# Altium footprint library PCB_Footprints.PcbLib: 303 footprints (part 10 of 19)
Each footprint in its own frame and in the unit in brackets; x right, y up, seen from the top. Pads: shape width x height; smd on the part's side, far side on the other; paste and mask are expansions set on the pad; w line width, h text height; cw(c..) or ccw(c..) is an arc to the next point about the centre after c.
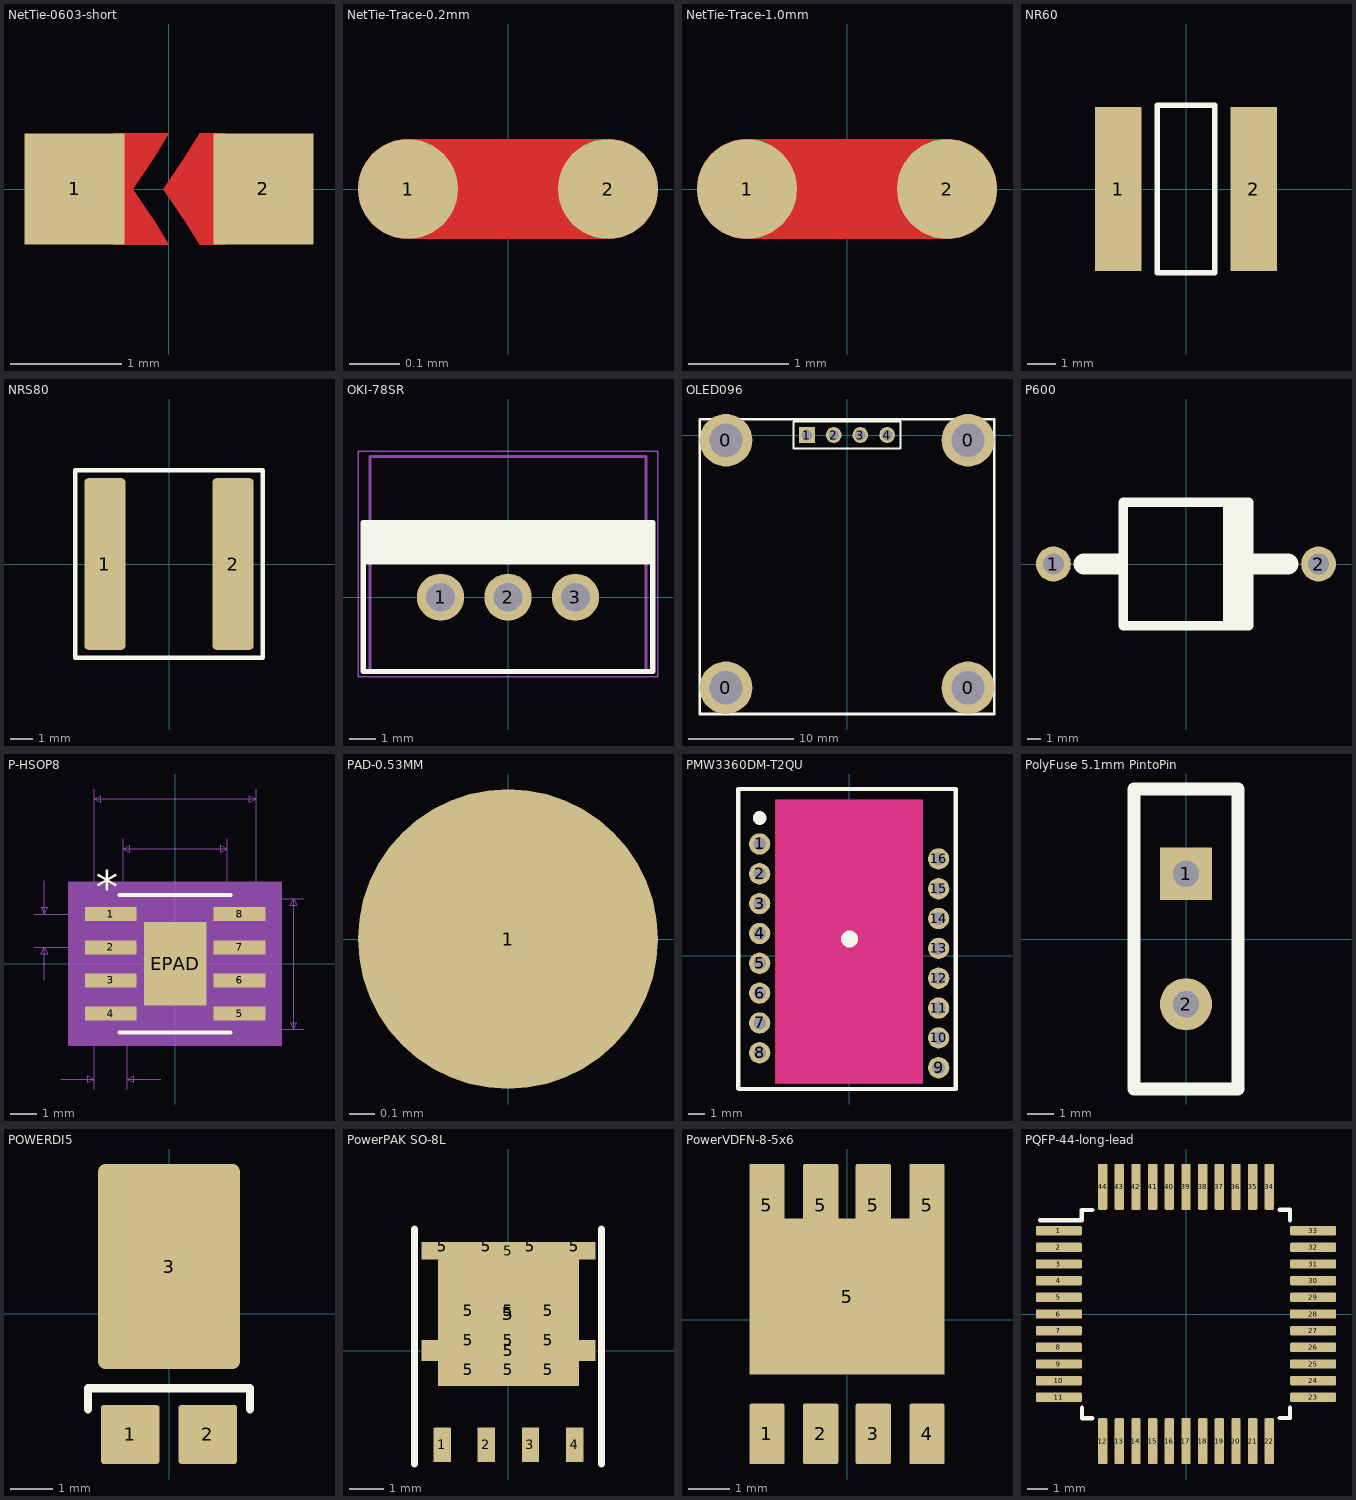
[diagram p9: the footprints below, top view; thin cyan lines are the x and y axes]

## NetTie-0603-short [mm] "Net Tie with an EIA 0603 land pattern"
pads (2):
  rect 0.9x1 smd paste-1 mask+0.102: 1(-0.85,0) 2(0.85,0)
Top Layer:
  region: 0.5,0.5 0.275,0.5 0.15,0.3 -0.05,0 0.15,-0.3 0.275,-0.5 0.5,-0.5
  region: -0.5,0.5 0,0.5 -0.125,0.3 -0.325,0 -0.125,-0.3 0,-0.5 -0.5,-0.5
Top Solder:
  region: -0.5,0.5 0.5,0.5 0.5,-0.5 -0.5,-0.5

## NetTie-Trace-0.2mm [mm] "Net Tie with a 0.2mm trace"
pads (2):
  round 0.2 smd paste-1 mask+0.102: 1(-0.2,0) 2(0.2,0)
Top Layer:
  lines w0.2: -0.2,0 0.2,0

## NetTie-Trace-1.0mm [mm] "Net Tie with a 1.0mm trace"
pads (2):
  round 1 smd paste-1 mask+0: 1(-1,0) 2(1,0)
Top Layer:
  lines w1: -1,0 1,0

## NR60 [mm] "Tayo Yuden NR60 Inductor serie."
height 2.8
pads (2):
  rect 1.6x5.7 smd: 1(-2.35,0) 2(2.35,0)
Top Overlay:
  lines w0.2: -1,-2.9 -1,2.9 1,2.9 1,-2.9 -1,-2.9
3D body: height 1, standoff 0, extent -3,-3 3,3
3D body: height 2.8, standoff 0, extent -3,-3 3,3

## NRS80 [mm] "Tayo Yuden NRS80 Inductor serie. from Manufacturer page for NRS8040T470MJGKV"
height 4.2
pads (2):
  rrect20% 1.8x7.5 smd: 1(-2.8,0) 2(2.8,0)
Top Overlay:
  lines w0.2: -4.1,-4.1 4.1,-4.1 4.1,4.1 -4.1,4.1 -4.1,-4.1
3D body: height 4.2, standoff 0, extent -4,-4 4,4

## OKI-78SR [mm] "Non-Isolated Switching Regulator DC-DC TO-220"
height 16.5
pads (3):
  round 1.78 hole 1.08: 1(-2.54,0) 2(0,0) 3(2.54,0)
Top Overlay:
  region: -5.45,2.8 5.45,2.8 5.5,2.75 5.5,1.25 -5.5,1.25
  lines w0.2: -5.45,-2.8 -5.45,2.8 5.45,2.8 5.45,-2.8 -5.45,-2.8
Mechanical 13:
  lines w0.1: -5.2,-2.8 5.2,-2.8 5.2,5.3 -5.2,5.3 -5.2,-2.8
Mechanical 15:
  lines w0.05: -5.65,-3 -5.65,5.5 5.65,5.5 5.65,-3 -5.65,-3
  lines w0.1: -0.45,0 0.45,0 ; 0,-0.45 0,0.45
3D body "User Library-OKI-78SR_Vert.STEP": height 16.6, standoff -3.2, extent -5.2,-2.823 5.2,5.25

## OLED096 [mm] "OLED096"
pads (8):
  round 5 hole 3.15: 0(-11.5,-24) 0(-11.5,-0.5) 0(11.5,-24) 0(11.5,-0.5)
  rect 1.5x1.5 hole 1: 1(-3.81,0)
  round 1.5 hole 1: 2(-1.27,0) 3(1.27,0) 4(3.81,0)
Top Overlay:
  lines w0.2: -5.08,-1.27 -5.08,1.27 5.08,1.27 5.08,-1.27 -5.08,-1.27
  lines w0.254: -14,-26.5 14,-26.5 14,1.5 5,1.5 -14,1.5 -14,-26.5
3D body "OLED096-3DModel.STEP": height 5.66, standoff -5.64, extent -13,-24.5 13,1.5

## P600 [mm] "P600 package for SLD TVS of Littelfuse"
pads (2):
  round 2.5 hole 1.5: 1(-9.5,0) 2(9.5,0)
Top Overlay:
  lines w0.7: 3,-4.425 3,4.425 ; 3.5,-4.425 3.5,4.425 ; 4,-4.425 4,4.425 ; 4.45,-4.425 -4.5,-4.425 -4.5,-0.75 -4.5,0.75 -4.5,4.425 4.45,4.425 ; 4.5,-4.425 4.5,-0.75 4.5,0.75 4.5,4.425
  lines w1.5: -7.3,0 -4.9,0 ; 4.5,0 7.3,0
3D body: height 8.85, standoff 0, extent -4.5,-4.422 4.35,4.422

## P-HSOP8 [mil]
pads (9):
  rect 78x21 smd paste+0 mask+0: 1(-97,75) 2(-97,25) 3(-97,-25) 4(-97,-75) 5(97,-75) 6(97,-25) 7(97,25) 8(97,75)
  rect 94x126 smd paste-62.5 mask+0: EPAD(0,0)
Top Overlay:
  lines w6: -83.5,-103.5 83.5,-103.5 ; -83.5,103.5 83.5,103.5
  text "*" at -119.5,91 h50
Top Paste:
  region: 43.06,-3.94 -43.06,-3.94 -43.06,-59.06 43.06,-59.06
  region: 43.06,59.06 -43.06,59.06 -43.06,3.94 43.06,3.94
Bottom 3D Body (Mech5):
  region: 161,-123.5 -161,-123.5 -161,123.5 161,123.5
Mechanical 7:
  lines w1: -212,25 -97,25 ; -212,75 -97,75 ; -197,-25 -197,25 ; -197,125 -197,75 ; -172,-173.5 -122,-173.5 ; -122,-188.5 -122,0 -122,263.5 ; -78.5,0 -78.5,188.5 ; -72,-188.5 -72,0 ; -22,-173.5 -72,-173.5 ; 0,-98.5 193.5,-98.5 ; 0,98.5 193.5,98.5 ; 78.5,0 78.5,188.5 ; 122,0 122,263.5 ; -197,25 -192,15 -202,15 -197,25 ; -197,75 -192,85 -202,85 -197,75 ; -122,-173.5 -132,-178.5 -132,-168.5 -122,-173.5 ; -122,248.5 -112,243.5 -112,253.5 -122,248.5 ; -122,248.5 122,248.5 ; -78.5,173.5 -68.5,168.5 -68.5,178.5 -78.5,173.5 ; -78.5,173.5 78.5,173.5 ; -72,-173.5 -62,-178.5 -62,-168.5 -72,-173.5 ; 78.5,173.5 68.5,168.5 68.5,178.5 78.5,173.5 ; 122,248.5 112,243.5 112,253.5 122,248.5 ; 178.5,-98.5 183.5,-88.5 173.5,-88.5 178.5,-98.5 ; 178.5,-98.5 178.5,98.5 ; 178.5,98.5 183.5,88.5 173.5,88.5 178.5,98.5
  text "0.05in/1.27mm" at -178.25,-218.5 h25
  text "0.05in/1.27mm" at -379.5,37.5 h25
  text "0.197in/5.004mm" at 198.5,-12.5 h25
  text "0.244in/6.198mm" at -93.75,268.5 h25
  text "0.157in/3.988mm" at -93.75,193.5 h25
  text "Alt 2 Padstyle: OX90Y60D30P" at -337.5,-598.5 h50
  text "Alt 1 Padstyle: OX60Y90D30P" at -337.5,-538.5 h50
  text "Heat Tab Padstyle: RX94Y126D0T" at -375,-418.5 h50
  text "Pin One Padstyle: RX78Y21D0T" at -350,-358.5 h50
  text "Default Padstyle: RX78Y21D0T" at -350,-298.5 h50
Mechanical 13:
  lines w0: -12,98.5 ccw(c0,98.5) 12,98.5
  lines w1: -122,-84.5 -78.5,-84.5 -78.5,-65.5 -122,-65.5 -122,-84.5 ; -122,-34.5 -78.5,-34.5 -78.5,-15.5 -122,-15.5 -122,-34.5 ; -122,15.5 -78.5,15.5 -78.5,34.5 -122,34.5 -122,15.5 ; -122,65.5 -78.5,65.5 -78.5,84.5 -122,84.5 -122,65.5 ; -78.5,-98.5 -78.5,98.5 78.5,98.5 78.5,-98.5 -78.5,-98.5 ; 78.5,-84.5 122,-84.5 122,-65.5 78.5,-65.5 78.5,-84.5 ; 78.5,-34.5 122,-34.5 122,-15.5 78.5,-15.5 78.5,-34.5 ; 78.5,15.5 122,15.5 122,34.5 78.5,34.5 78.5,15.5 ; 78.5,65.5 122,65.5 122,84.5 78.5,84.5 78.5,65.5
  text "*" at -76,45.5 h50
Mechanical 15:
  region: -88.5,-95.5 -146,-95.5 -146,95.5 -88.5,95.5 -88.5,108.5 88.5,108.5 88.5,95.5 146,95.5 146,-95.5 88.5,-95.5 88.5,-108.5 -88.5,-108.5
  lines w6: -146,-95.5 -88.5,-95.5 -88.5,-108.5 88.5,-108.5 88.5,-95.5 146,-95.5 146,95.5 88.5,95.5 88.5,108.5 -88.5,108.5 -88.5,95.5 -146,95.5 -146,-95.5
3D body "P-HSOP8-0405-1p27-002_TOS.step": height 67.09, standoff 0, extent -122.01,-98.5 122.01,98.5
3D body "Heatsink_6.5x6.5x3.5mm.step": height 200.79, standoff 62.99, extent -129.92,-127.95 125.98,127.95

## PAD-0.53MM [mm] "Hole 0.53mm"
pads (1):
  round 1.2 smd: 1(0,0)

## PMW3360DM-T2QU [mil] "PixArt Optical Tracking Sensor"
pads (16):
  round 50 hole 30: 1(-210,262.5) 2(-210,192.5) 3(-210,122.5) 4(-210,52.5) 5(-210,-17.5) 6(-210,-87.5) 7(-210,-157.5) 8(-210,-227.5) 9(210,-262.5) 10(210,-192.5) 11(210,-122.5) 12(210,-52.5) 13(210,17.5) 14(210,87.5) 15(210,157.5) 16(210,227.5)
Top Layer:
  pour cut-out: -173.23,366.14 -173.23,-299.21 173.23,-299.21 173.23,366.14
Top Layer keep-out:
  rectangle: -173.23,-299.21 173.23,366.14
Bottom Layer:
  pour cut-out: -173.23,366.14 -173.23,-299.21 173.23,-299.21 173.23,366.14
Top Overlay:
  circle w20: c1,39.5 r10
  circle w20: c-210,323.5 r6.08
  lines w10: -260,-311.5 -260,391.5 249,391.5 ; -259,-312.5 250,-312.5 250,391.5
Route Tool Path:
  lines w47.24: -149.61,-275.59 -149.61,342.52 149.61,342.52 149.61,-275.59 -149.61,-275.59

## PolyFuse 5.1mm PintoPin [mm] "PolyFuse 30R series"
height 13
pads (2):
  rect 2x2 hole 1: 1(0,2.5)
  round 2 hole 1: 2(0,-2.5)
Top Overlay:
  lines w0.5: -2,-5.75 2,-5.75 ; -2,-5.65 -2,5.75 2,5.75 ; 2,-5.7 2,5.7
3D body: height 6.45, standoff 0, extent -0.397,-2.899 0.4,-2.101
3D body: height 6.45, standoff 0, extent -0.397,2.101 0.4,2.899

## POWERDI5 [mm] "From Diodes Incorporated AP02002 Rev 97"
height 1
pads (3):
  rrect10% 1.39x1.4 smd: 1(-0.92,-2.857) 2(0.92,-2.857)
  rrect10% 3.36x4.86 smd: 3(0,1.125)
Top Overlay:
  lines w0.2: -1.92,-2.257 -1.92,-1.757 1.92,-1.757 1.92,-2.257
3D body "POWERDI5_DIO.step": height 1.21, standoff 0.01, extent -2.019,-3.159 2.019,3.445

## PowerPAK SO-8L [mm] "From Vishay SQJ418EP"
pads (20):
  rrect10% 0.5x1 smd: 1(-1.905,-2.715) 2(-0.635,-2.715) 3(0.635,-2.715) 4(1.905,-2.715)
  rrect2% 0.6x0.9 on Top Paste paste+0: 5(-1.9,3) 5(-0.633,3) 5(0.633,3) 5(1.9,3)
  rrect2% 0.9x0.6 on Top Paste paste-0.05 mask+0.075: 5(-1.15,-0.55) 5(-1.15,0.3) 5(-1.15,1.15) 5(0,-0.55) 5(0,0.3) 5(0,1.15) 5(1.15,-0.55) 5(1.15,0.3) 5(1.15,1.15)
  rect 5x0.61 smd paste-999 mask+0.075: 5(0,0)
  rect 4.061x4.14 smd paste-999 mask+0.075: 5(0,1.055)
  rect 5x0.51 smd paste-999 mask+0.075: 5(0,2.87)
Top Overlay:
  lines w0.2: -2.7,-3.267 -2.7,3.5 ; 2.675,-3.267 2.675,3.5
3D body "User Library-PowerPAK_SO-8L_SINGLE.STEP": height 1.07, standoff 0, extent -2.56,-3.08 2.56,3.07

## PowerVDFN-8-5x6 [mm] "PowerVDFN 8 pins, per Toshiba SOP Advance https://toshiba.semicon-storage.com/ap-en/design-support/package/detail.SOP%20Advance.html"
height 0.95
pads (9):
  rrect10% 0.85x1.45 smd: 1(-1.925,-2.75) 2(-0.635,-2.75) 3(0.635,-2.75) 4(1.925,-2.75)
  rrect10% 0.85x1.981 smd: 5(-1.925,2.75) 5(-0.635,2.75) 5(0.635,2.75) 5(1.925,2.75)
  rect 4.7x3.75 smd: 5(0,0.55)
3D body: height 0.96, standoff 0.95, extent -2.296,-2.299 -1.3,-1.301
3D body: height 0.95, standoff 0, extent -2.5,-2.5 2.5,2.5

## PQFP-44-long-lead [mm] "QFP, 44-Leads, Body 10.00x10.00mm, Pitch 0.8mm, IPC Medium Density, Generated from Altium IPC Wizard for HI-3593"
height 2.7
pads (44):
  rrect25% 2.2x0.45 smd: 1(-6.1,4) 2(-6.1,3.2) 3(-6.1,2.4) 4(-6.1,1.6) 5(-6.1,0.8) 6(-6.1,0) 7(-6.1,-0.8) 8(-6.1,-1.6) 9(-6.1,-2.4) 10(-6.1,-3.2) 11(-6.1,-4) 23(6.1,-4) 24(6.1,-3.2) 25(6.1,-2.4) 26(6.1,-1.6) 27(6.1,-0.8) 28(6.1,0) 29(6.1,0.8) 30(6.1,1.6) 31(6.1,2.4) 32(6.1,3.2) 33(6.1,4)
  rrect25% 0.45x2.2 smd: 12(-4,-6.1) 13(-3.2,-6.1) 14(-2.4,-6.1) 15(-1.6,-6.1) 16(-0.8,-6.1) 17(0,-6.1) 18(0.8,-6.1) 19(1.6,-6.1) 20(2.4,-6.1) 21(3.2,-6.1) 22(4,-6.1) 34(4,6.1) 35(3.2,6.1) 36(2.4,6.1) 37(1.6,6.1) 38(0.8,6.1) 39(0,6.1) 40(-0.8,6.1) 41(-1.6,6.1) 42(-2.4,6.1) 43(-3.2,6.1) 44(-4,6.1)
Top Overlay:
  lines w0.2: -7,4.5 -5,4.5 -5,5 -4.5,5 ; -5,-4.5 -5,-5 -4.5,-5 ; 4.5,-5 5,-5 5,-4.5 ; 4.5,5 5,5 5,4.5
3D body "User Library-LQFP 44.step": height 2.94, standoff 0.01, extent -6.4,-6.4 6.4,6.4